# Altium schematic symbol library NXP_60_26022015.SCHLIB: 1306 symbols (part 7 of 28) (continued)
## IP4855CX25 (continued)
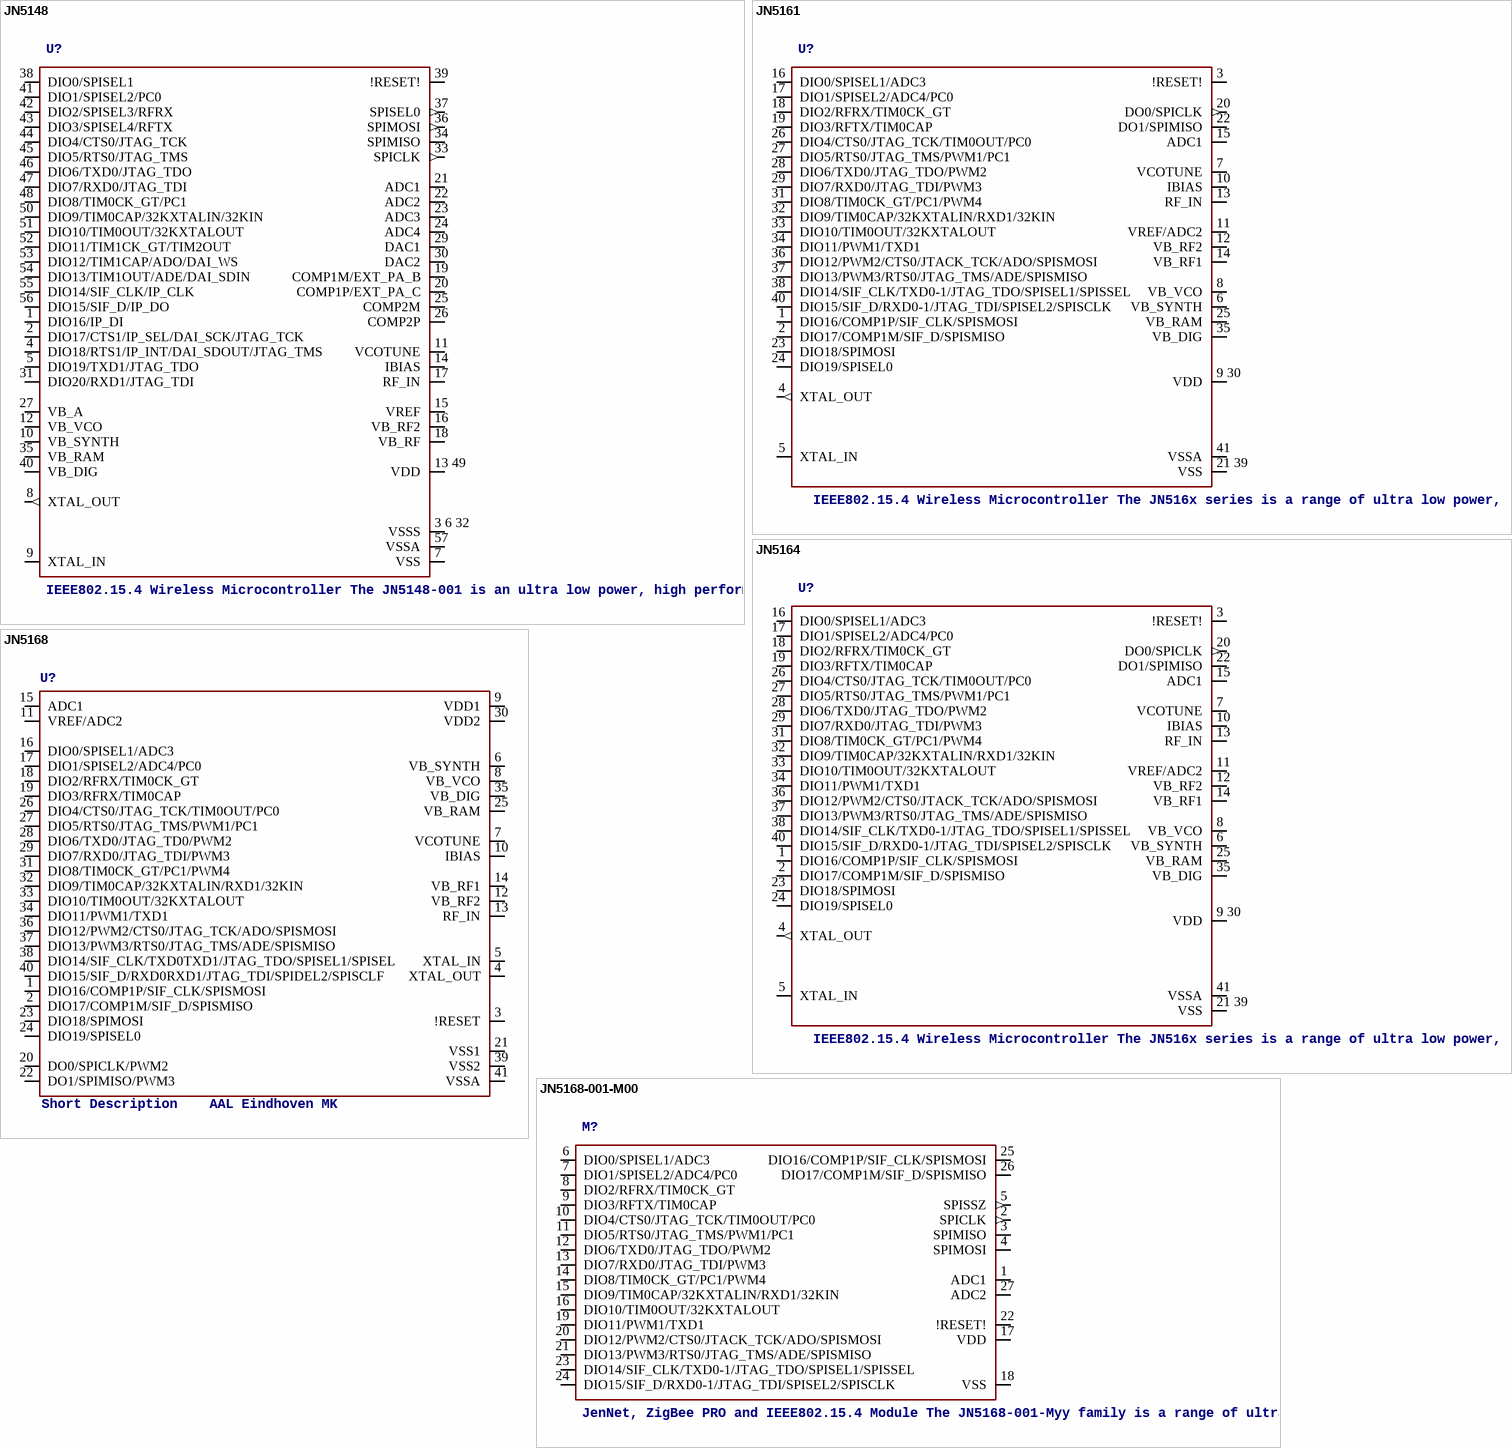
[diagram p37: symbols JN5148 to JN5168-001-M00]

## JN5148
designator U?, comment IEEE802.15.4 Wireless Microcontroller The JN5148-001 is an ultra low power, high performance wireless microcontroller targeted at JenNet and ZigBee PRO networking applications. The device features an enhanced 32-bit RISC processor offering high coding efficiency through variable width instructions, a multistage instruction pipeline and low power operation with programmable clock speeds. It also includes a 2.4GHz IEEE802.15.4 compliant transceiver, 128kB of ROM, 128kB of RAM, and a rich mix of analogue and digital peripherals. The large memory footprint allows the device to run both a network stack (e.g. ZigBee PRO) and an embedded application or in a coprocessor mode. The operating current is below 18mA, allowing operation direct from a coin cell. Enhanced peripherals include low power pulse counters running in sleep mode designed for pulse counting in AMR applications and a unique Time of Flight ranging engine, allowing accurate location services to be implemented on wireless sensor networks. It also includes a 4-wire I2S audio interface, to interface directly    AAL Eindhoven MK
footprint SOT684
pins: 1 DIO16/IP_DI, 2 DIO17/CTS1/IP_SEL/DAI_SCK/JTAG_TCK, 3 6 32 VSSS, 4 DIO18/RTS1/IP_INT/DAI_SDOUT/JTAG_TMS, 5 DIO19/TXD1/JTAG_TDO, 7 VSS (power), 8 XTAL_OUT (out), 9 XTAL_IN, 10 VB_SYNTH (power), 11 VCOTUNE, 12 VB_VCO (power), 13 49 VDD, 14 IBIAS, 15 VREF, 16 VB_RF2 (power), 17 RF_IN, 18 VB_RF (power), 19 COMP1M/EXT_PA_B, 20 COMP1P/EXT_PA_C, 21 ADC1, 22 ADC2, 23 ADC3, 24 ADC4, 25 COMP2M, 26 COMP2P, 27 VB_A (power), 29 DAC1, 30 DAC2, 31 DIO20/RXD1/JTAG_TDI, 33 SPICLK (out), 34 SPIMISO, 35 VB_RAM (power), 36 SPIMOSI (out), 37 SPISEL0 (out), 38 DIO0/SPISEL1, 39 !RESET!, 40 VB_DIG (power), 41 DIO1/SPISEL2/PC0, 42 DIO2/SPISEL3/RFRX, 43 DIO3/SPISEL4/RFTX, 44 DIO4/CTS0/JTAG_TCK, 45 DIO5/RTS0/JTAG_TMS, 46 DIO6/TXD0/JTAG_TDO, 47 DIO7/RXD0/JTAG_TDI, 48 DIO8/TIM0CK_GT/PC1, 50 DIO9/TIM0CAP/32KXTALIN/32KIN, 51 DIO10/TIM0OUT/32KXTALOUT, 52 DIO11/TIM1CK_GT/TIM2OUT, 53 DIO12/TIM1CAP/ADO/DAI_WS, 54 DIO13/TIM1OUT/ADE/DAI_SDIN, 55 DIO14/SIF_CLK/IP_CLK, 56 DIO15/SIF_D/IP_DO, 57 VSSA (power)

## JN5161
designator U?, comment IEEE802.15.4 Wireless Microcontroller The JN516x series is a range of ultra low power, high performance wireless microcontrollers suitable for JenNet-IP, ZigBee PRO, Remote Control, JenNet, and Active RFID applications. They feature an enhanced 32-bit RISC processor with embedded Flash and EEPROM memory, offering high coding efficiency through variable width instructions, a multi-stage instruction pipeline and low power operation with programmable clock speeds. They also include a 2.4GHz IEEE802.15.4 compliant transceiver and a comprehensive mix of analogue and digital peripherals. Three memory configurations are available to suit different applications. The best in class operating current is below 15mA, and, with a 0.6uA sleep timer mode, gives excellent battery life allowing operation direct from a coin cell. The peripherals support a wide range of applications. They include a 2-wire I2C, and SPI ports which can operate as either master or slave, a four channel ADC with battery and a temperature sensor. It can support a large switch matrix of up to 100 elements, or alternatively a 40 key capacitive touch pad.    AAL Eindhoven MK
EEPROM: 4kB; FLASH: 64kB; RAM: 8kB
footprint SOT618-1
pins: 1 DIO16/COMP1P/SIF_CLK/SPISMOSI, 2 DIO17/COMP1M/SIF_D/SPISMISO, 3 !RESET!, 4 XTAL_OUT (out), 5 XTAL_IN, 6 VB_SYNTH (power), 7 VCOTUNE, 8 VB_VCO (power), 9 30 VDD, 10 IBIAS, 11 VREF/ADC2, 12 VB_RF2 (power), 13 RF_IN, 14 VB_RF1 (power), 15 ADC1, 16 DIO0/SPISEL1/ADC3, 17 DIO1/SPISEL2/ADC4/PC0, 18 DIO2/RFRX/TIM0CK_GT, 19 DIO3/RFTX/TIM0CAP, 20 DO0/SPICLK (out), 21 39 VSS (power), 22 DO1/SPIMISO, 23 DIO18/SPIMOSI, 24 DIO19/SPISEL0, 25 VB_RAM (power), 26 DIO4/CTS0/JTAG_TCK/TIM0OUT/PC0, 27 DIO5/RTS0/JTAG_TMS/PWM1/PC1, 28 DIO6/TXD0/JTAG_TDO/PWM2, 29 DIO7/RXD0/JTAG_TDI/PWM3, 31 DIO8/TIM0CK_GT/PC1/PWM4, 32 DIO9/TIM0CAP/32KXTALIN/RXD1/32KIN, 33 DIO10/TIM0OUT/32KXTALOUT, 34 DIO11/PWM1/TXD1, 35 VB_DIG (power), 36 DIO12/PWM2/CTS0/JTACK_TCK/ADO/SPISMOSI, 37 DIO13/PWM3/RTS0/JTAG_TMS/ADE/SPISMISO, 38 DIO14/SIF_CLK/TXD0-1/JTAG_TDO/SPISEL1/SPISSEL, 40 DIO15/SIF_D/RXD0-1/JTAG_TDI/SPISEL2/SPISCLK, 41 VSSA (power)

## JN5164
designator U?, comment IEEE802.15.4 Wireless Microcontroller The JN516x series is a range of ultra low power, high performance wireless microcontrollers suitable for JenNet-IP, ZigBee PRO, Remote Control, JenNet, and Active RFID applications. They feature an enhanced 32-bit RISC processor with embedded Flash and EEPROM memory, offering high coding efficiency through variable width instructions, a multi-stage instruction pipeline and low power operation with programmable clock speeds. They also include a 2.4GHz IEEE802.15.4 compliant transceiver and a comprehensive mix of analogue and digital peripherals. Three memory configurations are available to suit different applications. The best in class operating current is below 15mA, and, with a 0.6uA sleep timer mode, gives excellent battery life allowing operation direct from a coin cell. The peripherals support a wide range of applications. They include a 2-wire I2C, and SPI ports which can operate as either master or slave, a four channel ADC with battery and a temperature sensor. It can support a large switch matrix of up to 100 elements, or alternatively a 40 key capacitive touch pad.    AAL Eindhoven MK
EEPROM: 4kB; FLASH: 160kB; RAM: 32kB
footprint SOT618-1
pins: 1 DIO16/COMP1P/SIF_CLK/SPISMOSI, 2 DIO17/COMP1M/SIF_D/SPISMISO, 3 !RESET!, 4 XTAL_OUT (out), 5 XTAL_IN, 6 VB_SYNTH (power), 7 VCOTUNE, 8 VB_VCO (power), 9 30 VDD, 10 IBIAS, 11 VREF/ADC2, 12 VB_RF2 (power), 13 RF_IN, 14 VB_RF1 (power), 15 ADC1, 16 DIO0/SPISEL1/ADC3, 17 DIO1/SPISEL2/ADC4/PC0, 18 DIO2/RFRX/TIM0CK_GT, 19 DIO3/RFTX/TIM0CAP, 20 DO0/SPICLK (out), 21 39 VSS (power), 22 DO1/SPIMISO, 23 DIO18/SPIMOSI, 24 DIO19/SPISEL0, 25 VB_RAM (power), 26 DIO4/CTS0/JTAG_TCK/TIM0OUT/PC0, 27 DIO5/RTS0/JTAG_TMS/PWM1/PC1, 28 DIO6/TXD0/JTAG_TDO/PWM2, 29 DIO7/RXD0/JTAG_TDI/PWM3, 31 DIO8/TIM0CK_GT/PC1/PWM4, 32 DIO9/TIM0CAP/32KXTALIN/RXD1/32KIN, 33 DIO10/TIM0OUT/32KXTALOUT, 34 DIO11/PWM1/TXD1, 35 VB_DIG (power), 36 DIO12/PWM2/CTS0/JTACK_TCK/ADO/SPISMOSI, 37 DIO13/PWM3/RTS0/JTAG_TMS/ADE/SPISMISO, 38 DIO14/SIF_CLK/TXD0-1/JTAG_TDO/SPISEL1/SPISSEL, 40 DIO15/SIF_D/RXD0-1/JTAG_TDI/SPISEL2/SPISCLK, 41 VSSA (power)

## JN5168
designator U?, comment Short Description    AAL Eindhoven MK
footprint SOT618-1
pins: 1 DIO16/COMP1P/SIF_CLK/SPISMOSI, 2 DIO17/COMP1M/SIF_D/SPISMISO, 3 !RESET, 4 XTAL_OUT, 5 XTAL_IN, 6 VB_SYNTH, 7 VCOTUNE, 8 VB_VCO, 9 VDD1, 10 IBIAS, 11 VREF/ADC2, 12 VB_RF2, 13 RF_IN, 14 VB_RF1, 15 ADC1, 16 DIO0/SPISEL1/ADC3, 17 DIO1/SPISEL2/ADC4/PC0, 18 DIO2/RFRX/TIM0CK_GT, 19 DIO3/RFRX/TIM0CAP, 20 DO0/SPICLK/PWM2, 21 VSS1, 22 DO1/SPIMISO/PWM3, 23 DIO18/SPIMOSI, 24 DIO19/SPISEL0, 25 VB_RAM, 26 DIO4/CTS0/JTAG_TCK/TIM0OUT/PC0, 27 DIO5/RTS0/JTAG_TMS/PWM1/PC1, 28 DIO6/TXD0/JTAG_TD0/PWM2, 29 DIO7/RXD0/JTAG_TDI/PWM3, 30 VDD2, 31 DIO8/TIM0CK_GT/PC1/PWM4, 32 DIO9/TIM0CAP/32KXTALIN/RXD1/32KIN, 33 DIO10/TIM0OUT/32KXTALOUT, 34 DIO11/PWM1/TXD1, 35 VB_DIG, 36 DIO12/PWM2/CTS0/JTAG_TCK/ADO/SPISMOSI, 37 DIO13/PWM3/RTS0/JTAG_TMS/ADE/SPISMISO, 38 DIO14/SIF_CLK/TXD0TXD1/JTAG_TDO/SPISEL1/SPISEL, 39 VSS2, 40 DIO15/SIF_D/RXD0RXD1/JTAG_TDI/SPIDEL2/SPISCLF, 41 VSSA

## JN5168-001-M00
designator M?, comment JenNet, ZigBee PRO and IEEE802.15.4 Module The JN5168-001-Myy family is a range of ultra low power, high performance surface mount modules targeted at IEEE 802.15.4, JenNet-IP, ZigBee Light Link, ZigBee Smart Energy and RF4CE networking applications, enabling users to realise products with minimum time to market and at the lowest cost.  They remove the need for expensive and lengthy development of custom RF board designs and test suites. The modules use NXP’s JN5168 wireless microcontroller to provide a comprehensive solution with large memory, high CPU and radio performance and all RF components included.  All that is required to develop and manufacture wireless control or sensing products is to connect a power supply and peripherals such as switches, actuators and sensors, considerably simplifying product development. Four module variants are available: JN5168-001-M00 with an integrated antenna, JN5168-001- M03 with an antenna connector and the JN5168-001-M05 and M06 with an antenna connector, power amplifier and LNA for extended range. The JN5168-001-M05 output power has been optimised for use in Europe and Asia.    AAL Eindhoven MK
DIO2: OK; DIO3: OK
footprint JN5168-001-M00
pins: 1 ADC1, 2 SPICLK (out), 3 SPIMISO, 4 SPIMOSI, 5 SPISSZ (out), 6 DIO0/SPISEL1/ADC3, 7 DIO1/SPISEL2/ADC4/PC0, 8 DIO2/RFRX/TIM0CK_GT, 9 DIO3/RFTX/TIM0CAP, 10 DIO4/CTS0/JTAG_TCK/TIM0OUT/PC0, 11 DIO5/RTS0/JTAG_TMS/PWM1/PC1, 12 DIO6/TXD0/JTAG_TDO/PWM2, 13 DIO7/RXD0/JTAG_TDI/PWM3, 14 DIO8/TIM0CK_GT/PC1/PWM4, 15 DIO9/TIM0CAP/32KXTALIN/RXD1/32KIN, 16 DIO10/TIM0OUT/32KXTALOUT, 17 VDD, 18 VSS (power), 19 DIO11/PWM1/TXD1, 20 DIO12/PWM2/CTS0/JTACK_TCK/ADO/SPISMOSI, 21 DIO13/PWM3/RTS0/JTAG_TMS/ADE/SPISMISO, 22 !RESET!, 23 DIO14/SIF_CLK/TXD0-1/JTAG_TDO/SPISEL1/SPISSEL, 24 DIO15/SIF_D/RXD0-1/JTAG_TDI/SPISEL2/SPISCLK, 25 DIO16/COMP1P/SIF_CLK/SPISMOSI, 26 DIO17/COMP1M/SIF_D/SPISMISO, 27 ADC2

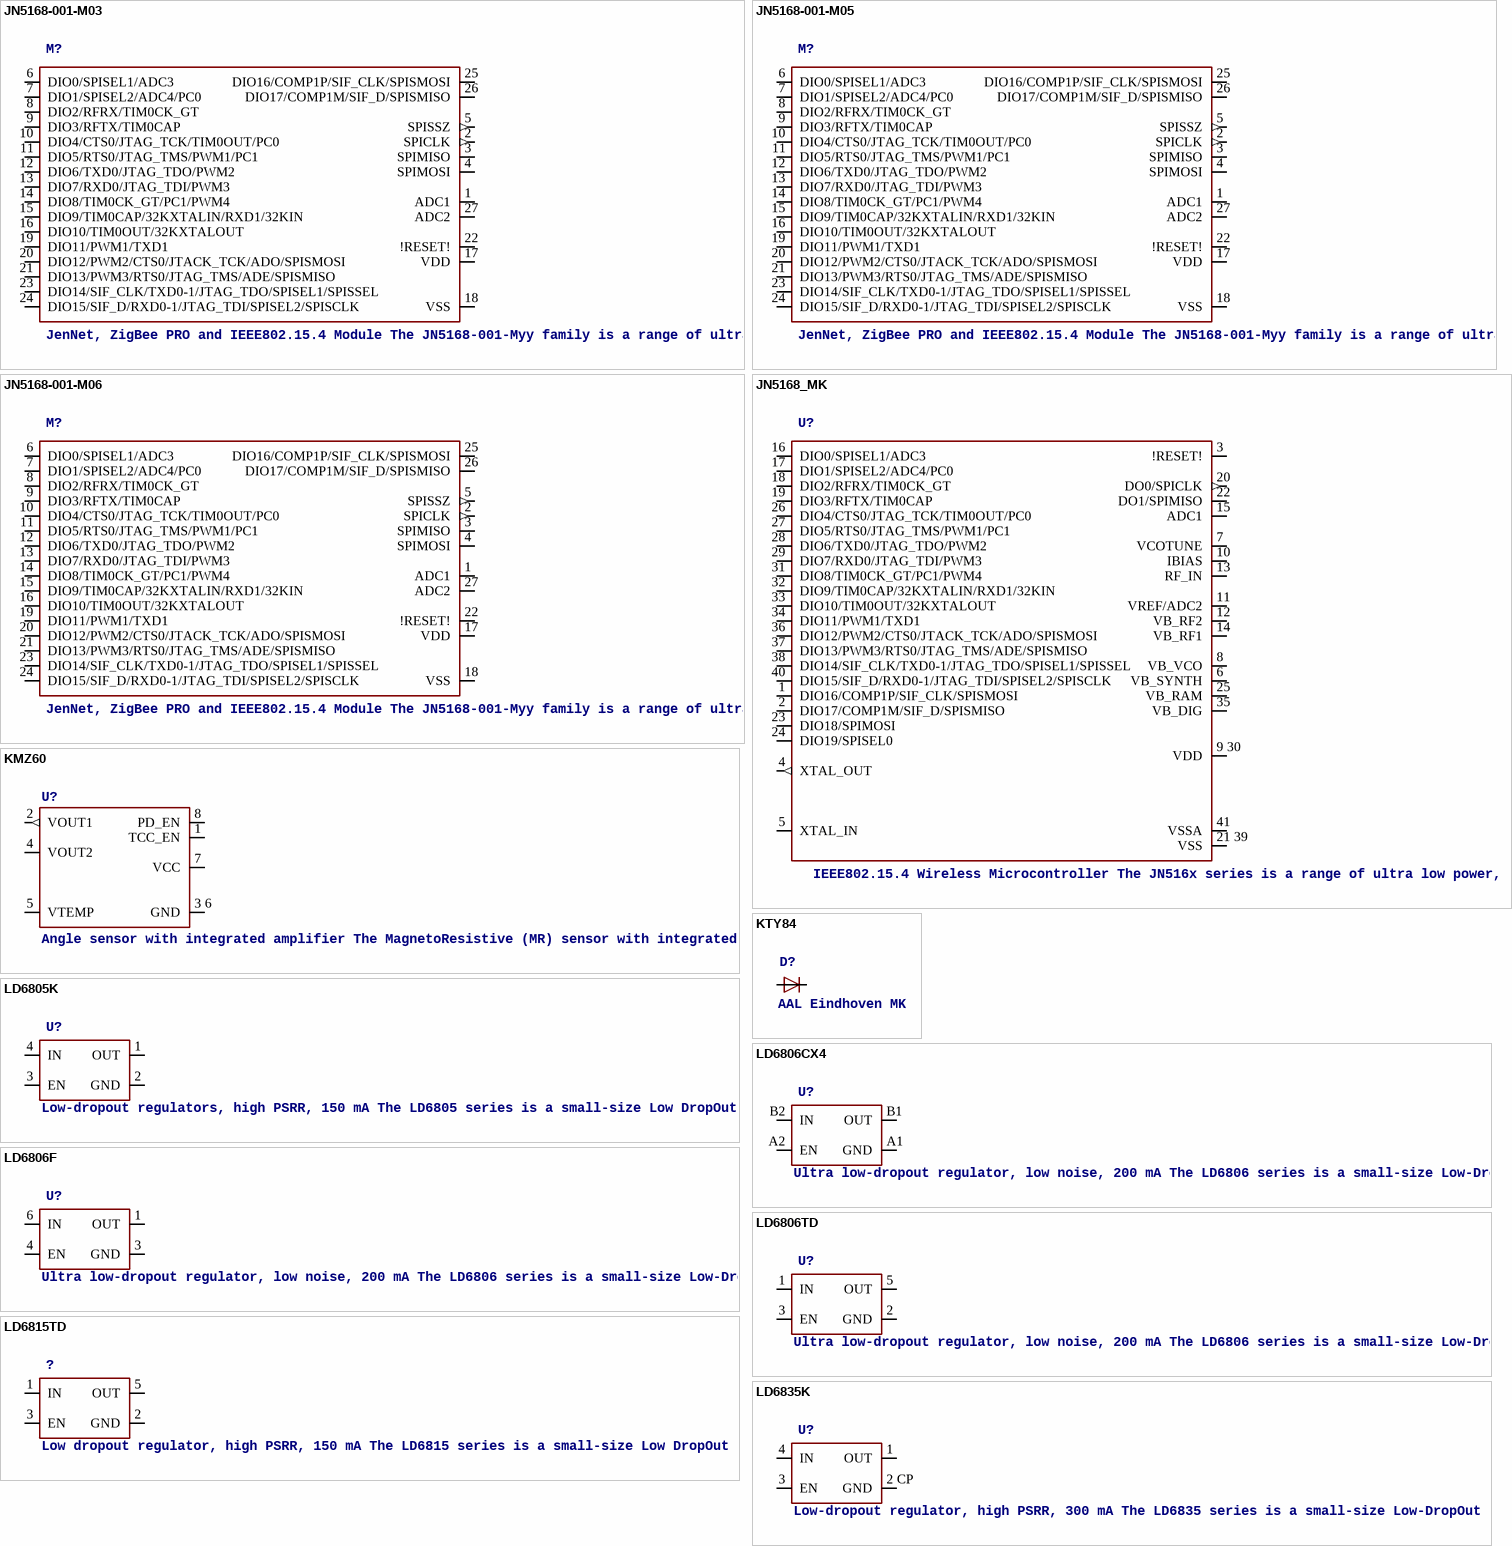
[diagram p38: symbols JN5168-001-M03 to LD6835K]

## JN5168-001-M03
designator M?, comment JenNet, ZigBee PRO and IEEE802.15.4 Module The JN5168-001-Myy family is a range of ultra low power, high performance surface mount modules targeted at IEEE 802.15.4, JenNet-IP, ZigBee Light Link, ZigBee Smart Energy and RF4CE networking applications, enabling users to realise products with minimum time to market and at the lowest cost.  They remove the need for expensive and lengthy development of custom RF board designs and test suites. The modules use NXP’s JN5168 wireless microcontroller to provide a comprehensive solution with large memory, high CPU and radio performance and all RF components included.  All that is required to develop and manufacture wireless control or sensing products is to connect a power supply and peripherals such as switches, actuators and sensors, considerably simplifying product development. Four module variants are available: JN5168-001-M00 with an integrated antenna, JN5168-001- M03 with an antenna connector and the JN5168-001-M05 and M06 with an antenna connector, power amplifier and LNA for extended range. The JN5168-001-M05 output power has been optimised for use in Europe and Asia.    AAL Eindhoven MK
DIO2: OK; DIO3: OK
footprint JN5168-001-M03
pins: 1 ADC1, 2 SPICLK (out), 3 SPIMISO, 4 SPIMOSI, 5 SPISSZ (out), 6 DIO0/SPISEL1/ADC3, 7 DIO1/SPISEL2/ADC4/PC0, 8 DIO2/RFRX/TIM0CK_GT, 9 DIO3/RFTX/TIM0CAP, 10 DIO4/CTS0/JTAG_TCK/TIM0OUT/PC0, 11 DIO5/RTS0/JTAG_TMS/PWM1/PC1, 12 DIO6/TXD0/JTAG_TDO/PWM2, 13 DIO7/RXD0/JTAG_TDI/PWM3, 14 DIO8/TIM0CK_GT/PC1/PWM4, 15 DIO9/TIM0CAP/32KXTALIN/RXD1/32KIN, 16 DIO10/TIM0OUT/32KXTALOUT, 17 VDD, 18 VSS (power), 19 DIO11/PWM1/TXD1, 20 DIO12/PWM2/CTS0/JTACK_TCK/ADO/SPISMOSI, 21 DIO13/PWM3/RTS0/JTAG_TMS/ADE/SPISMISO, 22 !RESET!, 23 DIO14/SIF_CLK/TXD0-1/JTAG_TDO/SPISEL1/SPISSEL, 24 DIO15/SIF_D/RXD0-1/JTAG_TDI/SPISEL2/SPISCLK, 25 DIO16/COMP1P/SIF_CLK/SPISMOSI, 26 DIO17/COMP1M/SIF_D/SPISMISO, 27 ADC2

## JN5168-001-M05
designator M?, comment JenNet, ZigBee PRO and IEEE802.15.4 Module The JN5168-001-Myy family is a range of ultra low power, high performance surface mount modules targeted at IEEE 802.15.4, JenNet-IP, ZigBee Light Link, ZigBee Smart Energy and RF4CE networking applications, enabling users to realise products with minimum time to market and at the lowest cost.  They remove the need for expensive and lengthy development of custom RF board designs and test suites. The modules use NXP’s JN5168 wireless microcontroller to provide a comprehensive solution with large memory, high CPU and radio performance and all RF components included.  All that is required to develop and manufacture wireless control or sensing products is to connect a power supply and peripherals such as switches, actuators and sensors, considerably simplifying product development. Four module variants are available: JN5168-001-M00 with an integrated antenna, JN5168-001- M03 with an antenna connector and the JN5168-001-M05 and M06 with an antenna connector, power amplifier and LNA for extended range. The JN5168-001-M05 output power has been optimised for use in Europe and Asia.    AAL Eindhoven MK
DIO2: x; DIO3: x
footprint JN5168-001-M06
pins: 1 ADC1, 2 SPICLK (out), 3 SPIMISO, 4 SPIMOSI, 5 SPISSZ (out), 6 DIO0/SPISEL1/ADC3, 7 DIO1/SPISEL2/ADC4/PC0, 8 DIO2/RFRX/TIM0CK_GT, 9 DIO3/RFTX/TIM0CAP, 10 DIO4/CTS0/JTAG_TCK/TIM0OUT/PC0, 11 DIO5/RTS0/JTAG_TMS/PWM1/PC1, 12 DIO6/TXD0/JTAG_TDO/PWM2, 13 DIO7/RXD0/JTAG_TDI/PWM3, 14 DIO8/TIM0CK_GT/PC1/PWM4, 15 DIO9/TIM0CAP/32KXTALIN/RXD1/32KIN, 16 DIO10/TIM0OUT/32KXTALOUT, 17 VDD, 18 VSS (power), 19 DIO11/PWM1/TXD1, 20 DIO12/PWM2/CTS0/JTACK_TCK/ADO/SPISMOSI, 21 DIO13/PWM3/RTS0/JTAG_TMS/ADE/SPISMISO, 22 !RESET!, 23 DIO14/SIF_CLK/TXD0-1/JTAG_TDO/SPISEL1/SPISSEL, 24 DIO15/SIF_D/RXD0-1/JTAG_TDI/SPISEL2/SPISCLK, 25 DIO16/COMP1P/SIF_CLK/SPISMOSI, 26 DIO17/COMP1M/SIF_D/SPISMISO, 27 ADC2

## JN5168-001-M06
designator M?, comment JenNet, ZigBee PRO and IEEE802.15.4 Module The JN5168-001-Myy family is a range of ultra low power, high performance surface mount modules targeted at IEEE 802.15.4, JenNet-IP, ZigBee Light Link, ZigBee Smart Energy and RF4CE networking applications, enabling users to realise products with minimum time to market and at the lowest cost.  They remove the need for expensive and lengthy development of custom RF board designs and test suites. The modules use NXP’s JN5168 wireless microcontroller to provide a comprehensive solution with large memory, high CPU and radio performance and all RF components included.  All that is required to develop and manufacture wireless control or sensing products is to connect a power supply and peripherals such as switches, actuators and sensors, considerably simplifying product development. Four module variants are available: JN5168-001-M00 with an integrated antenna, JN5168-001- M03 with an antenna connector and the JN5168-001-M05 and M06 with an antenna connector, power amplifier and LNA for extended range. The JN5168-001-M05 output power has been optimised for use in Europe and Asia.    AAL Eindhoven MK
DIO2: x; DIO3: x
footprint JN5168-001-M06
pins: 1 ADC1, 2 SPICLK (out), 3 SPIMISO, 4 SPIMOSI, 5 SPISSZ (out), 6 DIO0/SPISEL1/ADC3, 7 DIO1/SPISEL2/ADC4/PC0, 8 DIO2/RFRX/TIM0CK_GT, 9 DIO3/RFTX/TIM0CAP, 10 DIO4/CTS0/JTAG_TCK/TIM0OUT/PC0, 11 DIO5/RTS0/JTAG_TMS/PWM1/PC1, 12 DIO6/TXD0/JTAG_TDO/PWM2, 13 DIO7/RXD0/JTAG_TDI/PWM3, 14 DIO8/TIM0CK_GT/PC1/PWM4, 15 DIO9/TIM0CAP/32KXTALIN/RXD1/32KIN, 16 DIO10/TIM0OUT/32KXTALOUT, 17 VDD, 18 VSS (power), 19 DIO11/PWM1/TXD1, 20 DIO12/PWM2/CTS0/JTACK_TCK/ADO/SPISMOSI, 21 DIO13/PWM3/RTS0/JTAG_TMS/ADE/SPISMISO, 22 !RESET!, 23 DIO14/SIF_CLK/TXD0-1/JTAG_TDO/SPISEL1/SPISSEL, 24 DIO15/SIF_D/RXD0-1/JTAG_TDI/SPISEL2/SPISCLK, 25 DIO16/COMP1P/SIF_CLK/SPISMOSI, 26 DIO17/COMP1M/SIF_D/SPISMISO, 27 ADC2

## JN5168_MK
designator U?, comment IEEE802.15.4 Wireless Microcontroller The JN516x series is a range of ultra low power, high performance wireless microcontrollers suitable for JenNet-IP, ZigBee PRO, Remote Control, JenNet, and Active RFID applications. They feature an enhanced 32-bit RISC processor with embedded Flash and EEPROM memory, offering high coding efficiency through variable width instructions, a multi-stage instruction pipeline and low power operation with programmable clock speeds. They also include a 2.4GHz IEEE802.15.4 compliant transceiver and a comprehensive mix of analogue and digital peripherals. Three memory configurations are available to suit different applications. The best in class operating current is below 15mA, and, with a 0.6uA sleep timer mode, gives excellent battery life allowing operation direct from a coin cell. The peripherals support a wide range of applications. They include a 2-wire I2C, and SPI ports which can operate as either master or slave, a four channel ADC with battery and a temperature sensor. It can support a large switch matrix of up to 100 elements, or alternatively a 40 key capacitive touch pad.    AAL Eindhoven MK
EEPROM: 4kB; FLASH: 256kB; RAM: 32kB
footprint SOT618-1
pins: 1 DIO16/COMP1P/SIF_CLK/SPISMOSI, 2 DIO17/COMP1M/SIF_D/SPISMISO, 3 !RESET!, 4 XTAL_OUT (out), 5 XTAL_IN, 6 VB_SYNTH (power), 7 VCOTUNE, 8 VB_VCO (power), 9 30 VDD, 10 IBIAS, 11 VREF/ADC2, 12 VB_RF2 (power), 13 RF_IN, 14 VB_RF1 (power), 15 ADC1, 16 DIO0/SPISEL1/ADC3, 17 DIO1/SPISEL2/ADC4/PC0, 18 DIO2/RFRX/TIM0CK_GT, 19 DIO3/RFTX/TIM0CAP, 20 DO0/SPICLK (out), 21 39 VSS (power), 22 DO1/SPIMISO, 23 DIO18/SPIMOSI, 24 DIO19/SPISEL0, 25 VB_RAM (power), 26 DIO4/CTS0/JTAG_TCK/TIM0OUT/PC0, 27 DIO5/RTS0/JTAG_TMS/PWM1/PC1, 28 DIO6/TXD0/JTAG_TDO/PWM2, 29 DIO7/RXD0/JTAG_TDI/PWM3, 31 DIO8/TIM0CK_GT/PC1/PWM4, 32 DIO9/TIM0CAP/32KXTALIN/RXD1/32KIN, 33 DIO10/TIM0OUT/32KXTALOUT, 34 DIO11/PWM1/TXD1, 35 VB_DIG (power), 36 DIO12/PWM2/CTS0/JTACK_TCK/ADO/SPISMOSI, 37 DIO13/PWM3/RTS0/JTAG_TMS/ADE/SPISMISO, 38 DIO14/SIF_CLK/TXD0-1/JTAG_TDO/SPISEL1/SPISSEL, 40 DIO15/SIF_D/RXD0-1/JTAG_TDI/SPISEL2/SPISCLK, 41 VSSA (power)

## KMZ60
designator U?, comment Angle sensor with integrated amplifier The MagnetoResistive (MR) sensor with integrated amplifier is designed for angular control applications and BrushLess DC (BLDC) motors with even-numbered pole pairs. It consists of two microchips within one package, an angle sensor and an amplifier Integrated Circuit (IC). The circuit delivers cosine and sine output signals related to the angle of a rotating magnetic field. The output voltage range is ratiometric related to the supply voltage. The Temperature Coefficient (TC) of the sensor amplitude can be compensated. A ratiometric output voltage linear to the temperature is delivered. A Power-down mode is implemented.    AAL Eindhoven MK
footprint SOT96-1
pins: 1 TCC_EN, 2 VOUT1 (out), 3 6 GND (power), 4 VOUT2, 5 VTEMP, 7 VCC, 8 PD_EN

## KTY84
designator D?, comment AAL Eindhoven MK
footprint SOD68
pins: A, C K

## LD6805K
designator U?, comment Low-dropout regulators, high PSRR, 150 mA The LD6805 series is a small-size Low DropOut regulator (LDO) family with ultra high Power Supply Rejection Ratio (PSRR) of 75 dB. The voltage drop is 250 mV at 150 mA current rating. Operating voltages can range from 2.3 V to 5.5 V. The devices are available with fixed output voltages between 1.2 V to 3.6 V. The LD6805K/xxH devices show a high-ohmic state at the output pin when set to disabled mode. The LD6805K/xxP devices contain a pull-down switching transistor to provide a low-ohmic output state (auto discharge function) in disabled mode. The LD6805 series devices are available in a 1 x 1 mm DFN plastic package making them ideal for use in portable applications requiring component miniaturization. All devices are manufactured in monolithic silicon technology.   AAL Eindhoven MK
footprint SOT1194-1
pins: 1 OUT, 2 GND (power), 3 EN, 4 IN

## LD6806CX4
designator U?, comment Ultra low-dropout regulator, low noise, 200 mA The LD6806 series is a small-size Low-DropOut regulator (LDO) family with a typical voltage drop of 60 mV at 200 mA current rating. The device is available in three different surface-mounted packages, one 0.4 mm pitch CSP, one leadless plastic package SOT886 and one gull wing package SOT753. The operating voltage ranges from 2.3 V to 5.5 V and the output voltage ranges from 1.2 V to 3.6 V. LD6806x/xxH devices show a high-ohmic state at the output pin, while the LD6806x/xxP contains a pull-down switching transistor, to provide a low-ohmic output stage when the device is disabled. All devices use the same regulator design and are manufactured in monolithic silicon technology. These features make the LD6806 series ideal for use in applications requiring component miniaturization, such as mobile phone handsets, cordless telephones and personal digital devices.
footprint NX3P190/NX3P191
pins: A1 GND (power), A2 EN, B1 OUT, B2 IN

## LD6806F
designator U?, comment Ultra low-dropout regulator, low noise, 200 mA The LD6806 series is a small-size Low-DropOut regulator (LDO) family with a typical voltage drop of 60 mV at 200 mA current rating. The device is available in three different surface-mounted packages, one 0.4 mm pitch CSP, one leadless plastic package SOT886 and one gull wing package SOT753. The operating voltage ranges from 2.3 V to 5.5 V and the output voltage ranges from 1.2 V to 3.6 V. LD6806x/xxH devices show a high-ohmic state at the output pin, while the LD6806x/xxP contains a pull-down switching transistor, to provide a low-ohmic output stage when the device is disabled. All devices use the same regulator design and are manufactured in monolithic silicon technology. These features make the LD6806 series ideal for use in applications requiring component miniaturization, such as mobile phone handsets, cordless telephones and personal digital devices.
footprint SOT886
pins: 1 OUT, 3 GND (power), 4 EN, 6 IN

## LD6806TD
designator U?, comment Ultra low-dropout regulator, low noise, 200 mA The LD6806 series is a small-size Low-DropOut regulator (LDO) family with a typical voltage drop of 60 mV at 200 mA current rating. The device is available in three different surface-mounted packages, one 0.4 mm pitch CSP, one leadless plastic package SOT886 and one gull wing package SOT753. The operating voltage ranges from 2.3 V to 5.5 V and the output voltage ranges from 1.2 V to 3.6 V. LD6806x/xxH devices show a high-ohmic state at the output pin, while the LD6806x/xxP contains a pull-down switching transistor, to provide a low-ohmic output stage when the device is disabled. All devices use the same regulator design and are manufactured in monolithic silicon technology. These features make the LD6806 series ideal for use in applications requiring component miniaturization, such as mobile phone handsets, cordless telephones and personal digital devices.
footprint SOT753
pins: 1 IN, 2 GND (power), 3 EN, 5 OUT

## LD6815TD
designator ?, comment Low dropout regulator, high PSRR, 150 mA The LD6815 series is a small-size Low DropOut regulator (LDO) family with ultra high Power Supply Rejection Ratio (PSRR) of 75 dB. The voltage drop is 250 mV at 150 mA current rating. Operating voltages can range from 2.3 V to 5.5 V. The devices are available with fixed output voltages between 1.2 V and 3.6 V. The LD6815TD/xxH devices show a high-ohmic state at the output pin when set to disabled mode. The LD6815TD/xxP devices contain a pull-down switching transistor to provide a low-ohmic output state (auto discharge function) in disabled mode. The LD6815 series devices are available in SOT753 (TSOP5) plastic package. All devices are manufactured in monolithic silicon technology.    AAL Eindhoven MK
12NC: 9340 667 69125; VOLTAGE: 1.2V; 12NC: 9340 667 79125; 12NC: 9340 667 71125; VOLTAGE: 1.5V; 12NC: 9340 667 81125; 12NC: 9340 667 72125; VOLTAGE: 1.8V; 12NC: 9340 667 82125; 12NC: 9340 671 26125; VOLTAGE: 2.1V; 12NC: 9340 669 71125; 12NC: 9340 667 73125; VOLTAGE: 2.5V; 12NC: 9340 667 83125; 12NC: 9340 667 74125; VOLTAGE: 2.8V; 12NC: 9340 667 84125; 12NC: 9340 667 75125; VOLTAGE: 2.9V; 12NC: 9340 667 85125; 12NC: 9340 667 76125; VOLTAGE: 3.0V; 12NC: 9340 667 86125; 12NC: 9340 667 77125; VOLTAGE: 3.3V; 12NC: 9340 667 87125; 12NC: 9340 667 78125; VOLTAGE: 3.6V; 12NC: 9340 667 88125; IMPEDANCE: high; IMPEDANCE: low
footprint SOT753
pins: 1 IN, 2 GND (power), 3 EN, 5 OUT

## LD6835K
designator U?, comment Low-dropout regulator, high PSRR, 300 mA The LD6835 series is a small-size Low-DropOut (LDO) regulator family with a high-Power Supply Rejection Ratio (PSRR) of 75 dB and a voltage drop of 240 mV at 300 mA current rating. Operating voltages range from 1.75 V to 5.5 V. The products are available with fixed nominal output voltages VO(nom) between 1.2 V and 3.6 V. The LD6835 series products are available in a DFN1010C-4 (SOT1194-1) plastic package with a size of 1 mm  1 mm  0.55 mm. The devices are ideal for use in portable applications requiring component miniaturization.    AAL Eindhoven MK
HIGH_OHMIC: yes; OUTPUT: 1V2; HIGH_OHMIC: no; OUTPUT: 1V5; OUTPUT: 1V8; OUTPUT: 2V2; OUTPUT: 2V5; OUTPUT: 2V85; OUTPUT: 2V8; OUTPUT: 2V9; OUTPUT: 3V0; OUTPUT: 3V1; OUTPUT: 3V3
footprint SOT1194-1
pins: 1 OUT, 2 CP GND (power), 3 EN, 4 IN

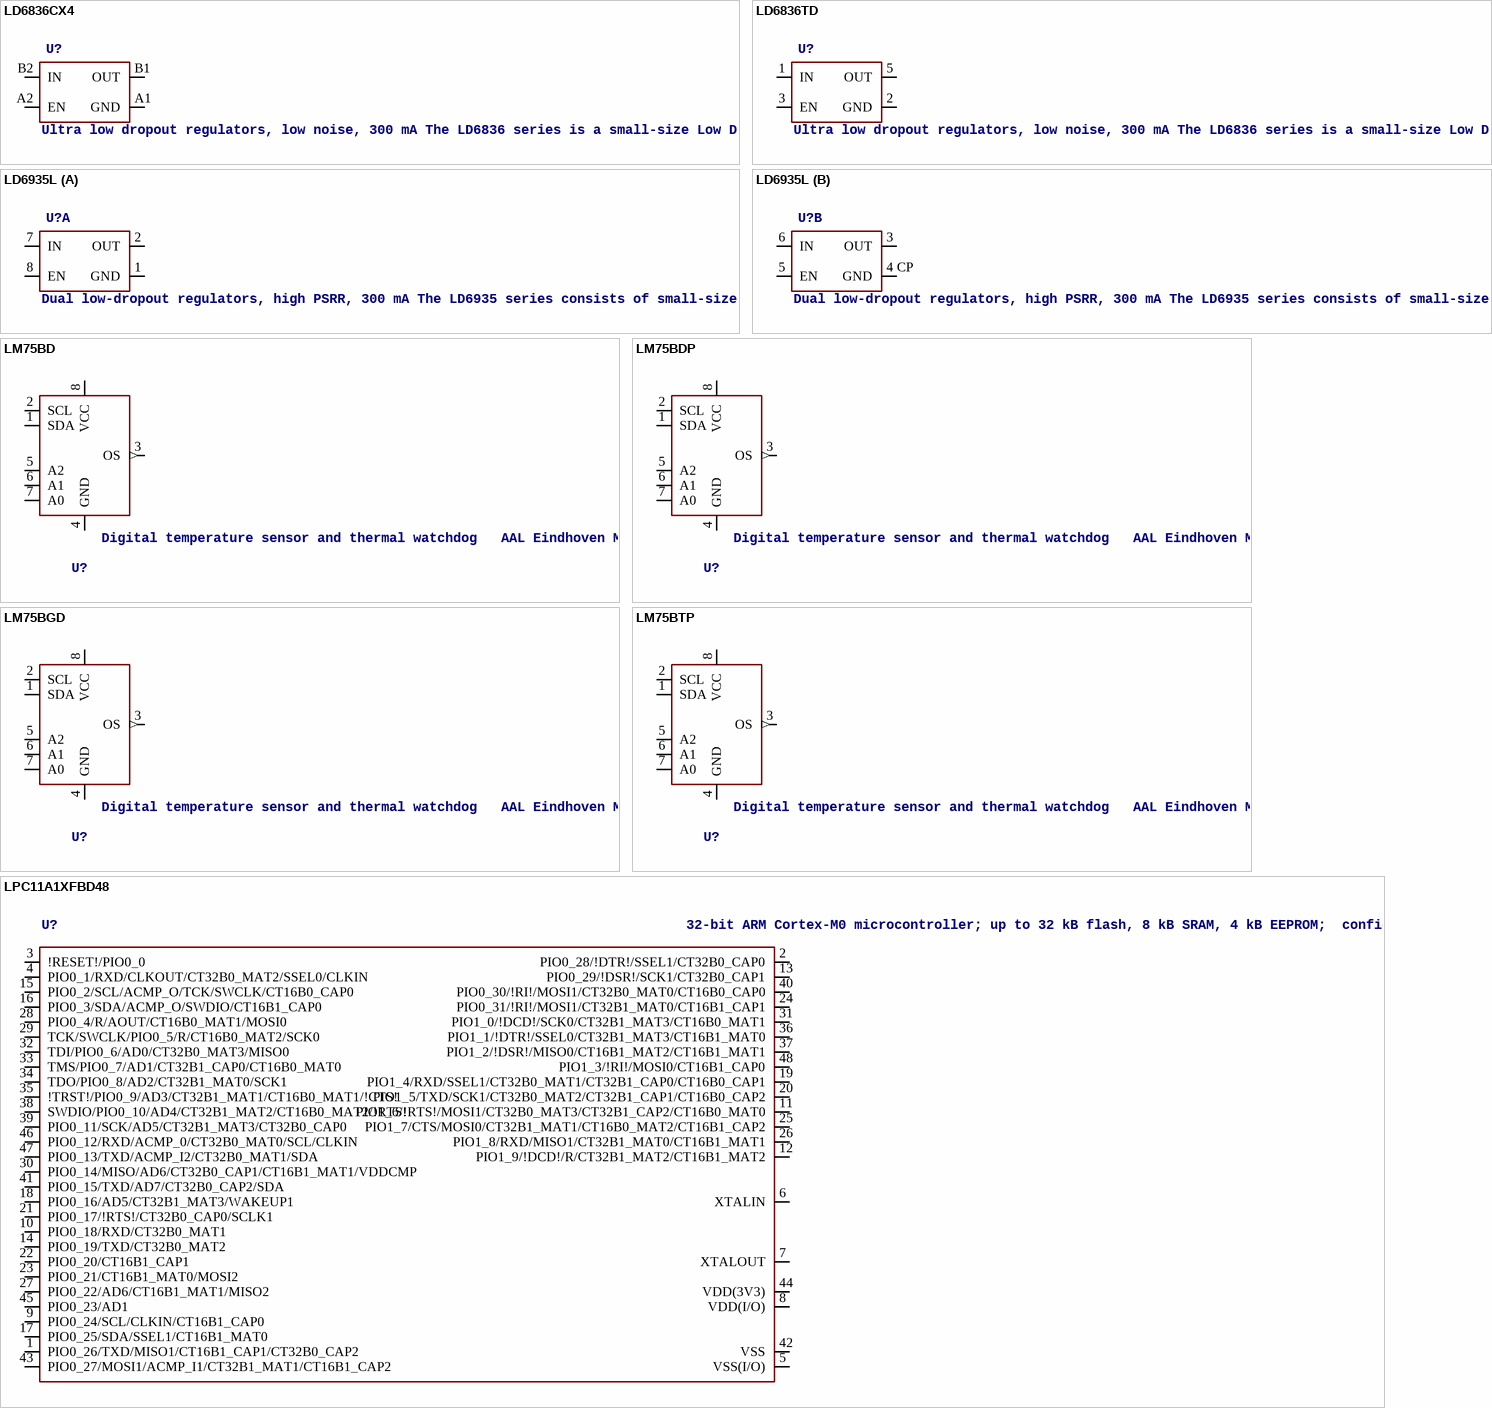
[diagram p39: symbols LD6836CX4 to LPC11A1XFBD48]

## LD6836CX4
designator U?, comment Ultra low dropout regulators, low noise, 300 mA The LD6836 series is a small-size Low DropOut regulator (LDO) family with a typical voltage drop of 90 mV at 300 mA current rating. Operating input voltages can range from 2.3 V to 5.5 V. The devices are available with fixed output voltages between 1.2 V and 3.6 V. In disabled mode the LD6836x/xxH devices show a high-ohmic state at the output pin while the LD6836x/xxP devices contain a pull-down switching transistor to provide a low-ohmic output state (auto discharge function). The LD6836CX4 and LD6836CX4/C devices are in a 0.4 mm pitch Wafer-Level Chip-Scale Package (WLCSP) making them ideal for use in portable applications requiring component miniaturization. The LD6836TD devices are in a small SOT753 Surface-Mounted Device (SMD) plastic package. All devices are manufactured in monolithic silicon technology.    AAL Eindhoven MK
HIGH_OHMIC: yes; OUTPUT: 1V2; HIGH_OHMIC: no; OUTPUT: 1V4; OUTPUT: 1V6; OUTPUT: 1V8; OUTPUT: 2V0; OUTPUT: 2V1; OUTPUT: 2V2; OUTPUT: 2v3; OUTPUT: 2V5; OUTPUT: 2V7; OUTPUT: 2V8; OUTPUT: 2V9; OUTPUT: 3V0; OUTPUT: 3V3; OUTPUT: 3V6; OUTPUT: 2V3
footprint WLCSP4
pins: A1 GND (power), A2 EN, B1 OUT, B2 IN

## LD6836TD
designator U?, comment Ultra low dropout regulators, low noise, 300 mA The LD6836 series is a small-size Low DropOut regulator (LDO) family with a typical voltage drop of 90 mV at 300 mA current rating. Operating input voltages can range from 2.3 V to 5.5 V. The devices are available with fixed output voltages between 1.2 V and 3.6 V. In disabled mode the LD6836x/xxH devices show a high-ohmic state at the output pin while the LD6836x/xxP devices contain a pull-down switching transistor to provide a low-ohmic output state (auto discharge function). The LD6836CX4 and LD6836CX4/C devices are in a 0.4 mm pitch Wafer-Level Chip-Scale Package (WLCSP) making them ideal for use in portable applications requiring component miniaturization. The LD6836TD devices are in a small SOT753 Surface-Mounted Device (SMD) plastic package. All devices are manufactured in monolithic silicon technology.    AAL Eindhoven MK
HIGH_OHMIC: yes; OUTPUT: 1V2; HIGH_OHMIC: no; OUTPUT: 1V4; OUTPUT: 1V6; OUTPUT: 1V8; OUTPUT: 2V0; OUTPUT: 2V1; OUTPUT: 2V2; OUTPUT: 2v3; OUTPUT: 2V5; OUTPUT: 2V7; OUTPUT: 2V8; OUTPUT: 2V9; OUTPUT: 3V0; OUTPUT: 3V3; OUTPUT: 3V6; OUTPUT: 2V3
footprint SOT753
pins: 1 IN, 2 GND (power), 3 EN, 5 OUT